# Altium footprint library SMotlaq-PCB_lib.PcbLib: 186 footprints (part 10 of 12)
Each footprint in its own frame and in the unit in brackets; x right, y up, seen from the top. Pads: shape width x height; smd on the part's side, far side on the other; paste and mask are expansions set on the pad; w line width, h text height; cw(c..) or ccw(c..) is an arc to the next point about the centre after c.
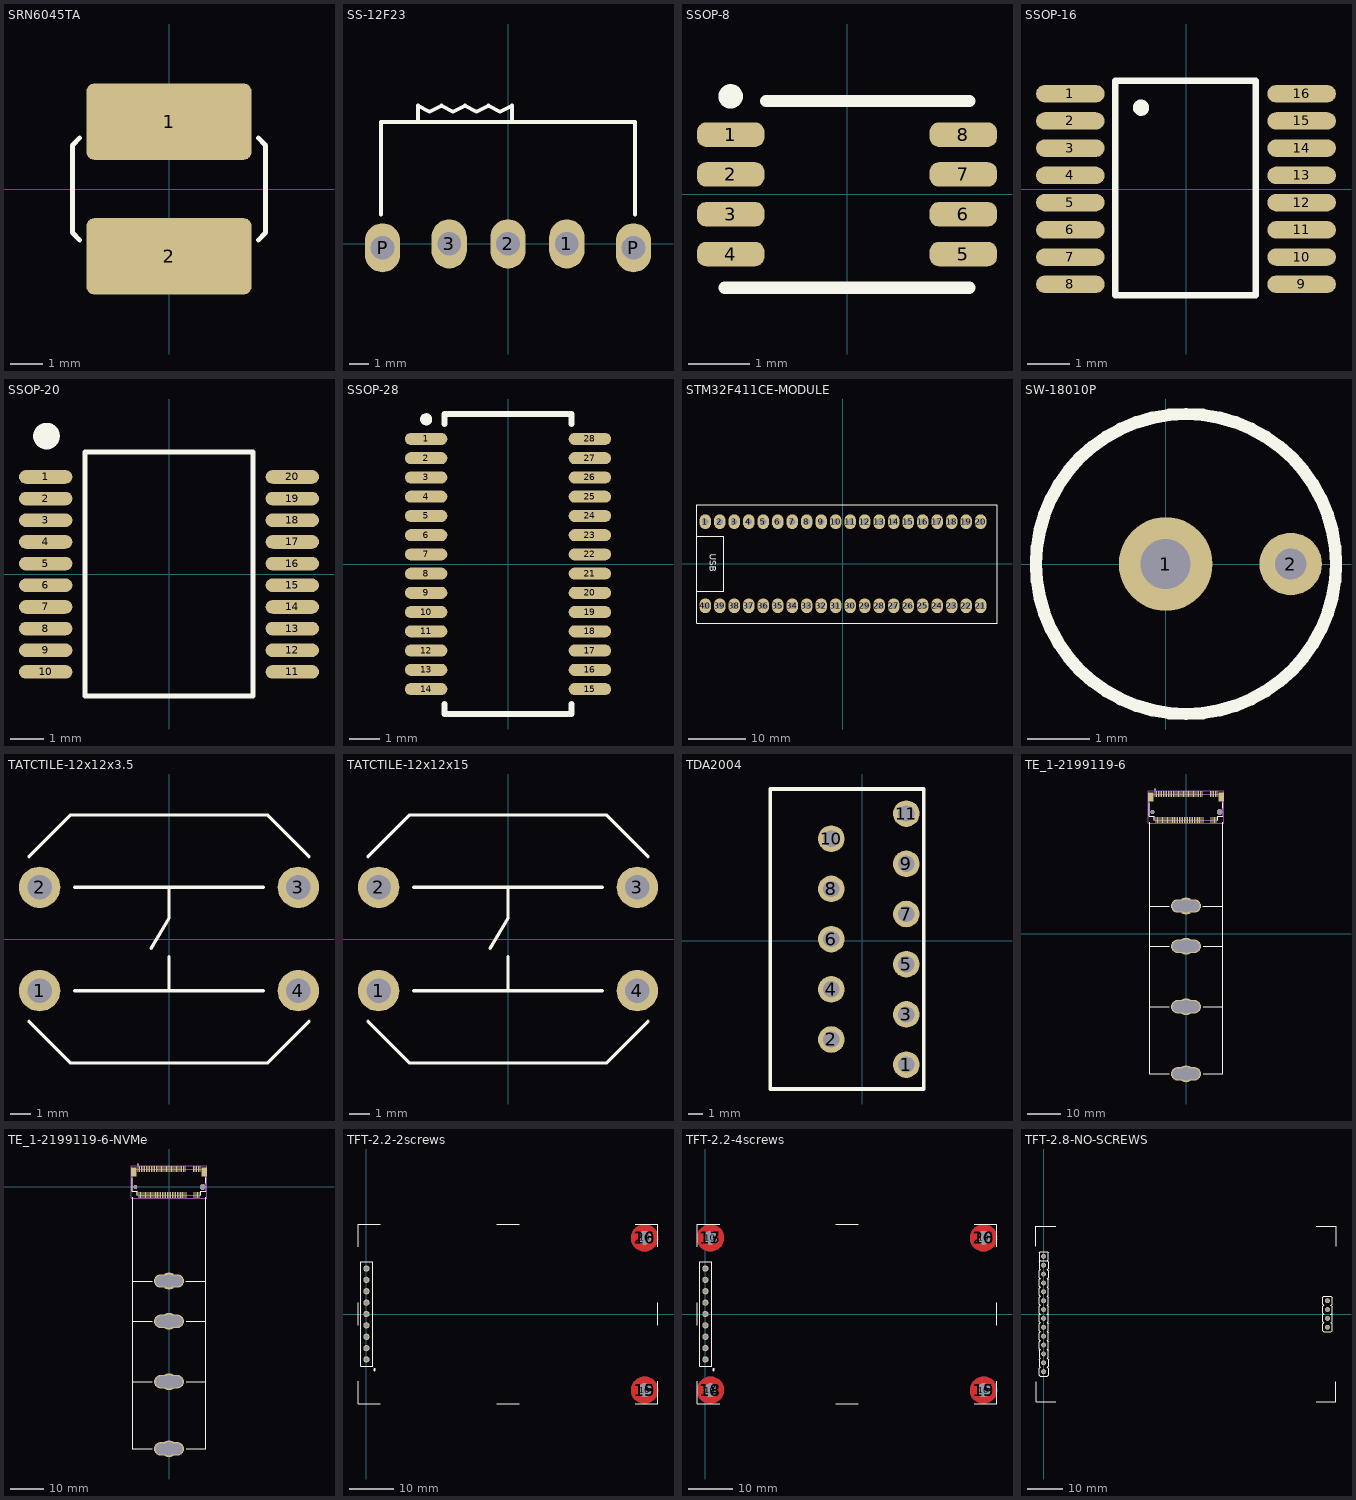
[diagram p9: the footprints below, top view; thin cyan lines are the x and y axes]

## SRN6045TA [mm]
pads (2):
  rrect20% 5.1x2.35 smd: 1(0,2.075) 2(0,-2.075)
Top Overlay:
  lines w0.15: -2.75,-1.575 -2.975,-1.35 -2.975,0 -2.975,1.35 -2.75,1.575 ; 2.75,-1.575 2.975,-1.35 2.975,0 2.975,1.35 2.75,1.575
3D body "User Library-SRN6045TA Series.step": height 4.2, standoff 0, extent -3,-3 3,3

## SS-12F23 [mm] "SPDT onboard slide switch"
pads (5):
  oval 1.8x2.5 hole 1.2 mask+0.075: 1(3,0) 2(0,0) 3(-3,0) P(-6.4,-0.2) P(6.4,-0.2)
Top Overlay:
  lines w0.2: -6.475,1.5 -6.475,6.2 ; -6.475,6.225 6.475,6.225 ; -4.6,6.225 -4.6,7.05 -4,6.75 -3.4,7.05 -2.8,6.75 -2.2,7.05 -1.6,6.75 -1,7.05 -0.4,6.75 0.2,7.05 0.2,6.25 ; 6.475,1.5 6.475,6.2
3D body "User Library-SLIDE SWITCH SS12F23.STEP": height 5.25, standoff -3.85, extent -6.5,-0.65 6.5,12.25

## SSOP-8 [mm]
height 1.2
pads (8):
  rrect75% 1.1x0.4 smd: 1(-1.9,0.975) 2(-1.9,0.325) 3(-1.9,-0.325) 4(-1.9,-0.975) 5(1.9,-0.975) 6(1.9,-0.325) 7(1.9,0.325) 8(1.9,0.975)
Top Overlay:
  circle w0.2: c-1.9,1.6 r0.1
  lines w0.2: -2,-1.525 2,-1.525 ; -1.325,1.525 2,1.525
3D body "User Library-DCT-8.STEP": height 1.3, standoff 0, extent -2.125,-1.525 2.075,1.525

## SSOP-16 [mm]
pads (16):
  rrect100% 1.6x0.41 smd: 1(-2.7,2.222) 2(-2.7,1.587) 3(-2.7,0.953) 4(-2.7,0.318) 5(-2.7,-0.318) 6(-2.7,-0.953) 7(-2.7,-1.587) 8(-2.7,-2.222) 9(2.7,-2.222) 10(2.7,-1.587) 11(2.7,-0.953) 12(2.7,-0.318) 13(2.7,0.318) 14(2.7,0.953) 15(2.7,1.587) 16(2.7,2.222)
Top Overlay:
  circle w0.2: c-1.05,1.897 r0.09
  lines w0.15: -1.65,-2.478 -1.65,2.522 1.625,2.522 1.625,-2.478 -1.65,-2.478
3D body "User Library-SSOP 16-pin.step": height 1.7, standoff -0.04, extent -3.127,-2.477 3.127,2.523

## SSOP-20 [mm]
pads (20):
  rrect100% 1.6x0.41 smd: 1(-3.7,2.925) 2(-3.7,2.275) 3(-3.7,1.625) 4(-3.7,0.975) 5(-3.7,0.325) 6(-3.7,-0.325) 7(-3.7,-0.975) 8(-3.7,-1.625) 9(-3.7,-2.275) 10(-3.7,-2.925) 11(3.7,-2.925) 12(3.7,-2.275) 13(3.7,-1.625) 14(3.7,-0.975) 15(3.7,-0.325) 16(3.7,0.325) 17(3.7,0.975) 18(3.7,1.625) 19(3.7,2.275) 20(3.7,2.925)
Top Overlay:
  circle w0.4: c-3.675,4.15 r0.2
  lines w0.15: -2.525,-3.65 -2.525,0 -2.525,3.675 -0.517,3.675 2.525,3.675 2.525,0 2.525,-3.65 -0.492,-3.65 -2.525,-3.65
3D body "User Library-SSOP 20 PIN-1.step": height 1.98, standoff -0.01, extent -3.95,-3.665 3.95,3.665

## SSOP-28 [mm] "SSOP, 28-Leads, 9.9x3.9mm, Pitch 0.635mm"
height 1.75
pads (28):
  oval 1.4x0.4 smd: 1(-2.7,4.127) 2(-2.7,3.492) 3(-2.7,2.857) 4(-2.7,2.222) 5(-2.7,1.587) 6(-2.7,0.953) 7(-2.7,0.318) 8(-2.7,-0.318) 9(-2.7,-0.953) 10(-2.7,-1.587) 11(-2.7,-2.222) 12(-2.7,-2.857) 13(-2.7,-3.492) 14(-2.7,-4.127) 15(2.7,-4.127) 16(2.7,-3.492) 17(2.7,-2.857) 18(2.7,-2.222) 19(2.7,-1.587) 20(2.7,-0.953) 21(2.7,-0.318) 22(2.7,0.318) 23(2.7,0.953) 24(2.7,1.587) 25(2.7,2.222) 26(2.7,2.857) 27(2.7,3.492) 28(2.7,4.127)
Top Overlay:
  circle w0.2: c-2.7,4.775 r0.1
  lines w0.2: -2.1,-4.625 -2.1,-4.95 2.1,-4.95 2.1,-4.625 ; -2.1,4.625 -2.1,4.95 2.1,4.95 2.1,4.625
3D body "SOG63_28.step": height 1.75, standoff 0, extent -3,-4.95 3,4.95

## STM32F411CE-MODULE [mm]
pads (40):
  oval 2x2.6 hole 1.1: 1(-24.13,7.37) 2(-21.59,7.37) 3(-19.05,7.37) 4(-16.51,7.37) 5(-13.97,7.37) 6(-11.43,7.37) 7(-8.89,7.37) 8(-6.35,7.37) 9(-3.81,7.37) 10(-1.27,7.37) 11(1.27,7.37) 12(3.81,7.37) 13(6.35,7.37) 14(8.89,7.37) 15(11.43,7.37) 16(13.97,7.37) 17(16.51,7.37) 18(19.05,7.37) 19(21.59,7.37) 20(24.13,7.37) 21(24.13,-7.37) 22(21.59,-7.37) 23(19.05,-7.37) 24(16.51,-7.37) 25(13.97,-7.37) 26(11.43,-7.37) 27(8.89,-7.37) 28(6.35,-7.37) 29(3.81,-7.37) 30(1.27,-7.37) 31(-1.27,-7.37) 32(-3.81,-7.37) 33(-6.35,-7.37) 34(-8.89,-7.37) 35(-11.43,-7.37) 36(-13.97,-7.37) 37(-16.51,-7.37) 38(-19.05,-7.37) 39(-21.59,-7.37) 40(-24.13,-7.37)
Top Overlay:
  lines w0.2: -25.58,-4.855 -20.88,-4.855 -20.88,4.855 -25.58,4.855 ; -25.58,-10.445 -25.58,10.355 26.995,10.355 26.995,-10.445 -25.58,-10.445
  text "USB" at -23.796,1.781 h2
3D body "stm32f411-module.STEP": height 15.1, standoff -3.16, extent -25.56,-10.433 26.98,10.347

## SW-18010P [mm]
pads (2):
  round 1.5 hole 0.8: 1(0,0)
  round 1 hole 0.5: 2(2,0)
Top Overlay:
  circle w0.2: c0.325,0 r2.4
3D body "SW-18010P-2.STEP": height 17.53, standoff -1.07, extent -1.925,-2.25 2.575,2.25

## TATCTILE-12x12x3.5 [mm]
pads (4):
  round 2 hole 1.2: 1(-6.25,-2.5) 2(-6.25,2.5) 3(6.25,2.5) 4(6.25,-2.5)
Top Overlay:
  lines w0.15: -6.775,-3.975 -4.75,-6 4.75,-6 6.775,-3.975 ; -6.775,3.975 -4.75,6 4.75,6 6.775,3.975 ; -4.575,-2.5 4.575,-2.5 ; -4.575,2.5 4.575,2.5 ; -0.866,-0.464 0,1 0,2.5 ; 0,-2.5 0,-0.85
3D body "User Library-Tactile Switch 12x12x8.step": height 8.15, standoff -3.25, extent -6.773,-6 6.773,6

## TATCTILE-12x12x15 [mm]
pads (4):
  round 2 hole 1.2: 1(-6.25,-2.5) 2(-6.25,2.5) 3(6.25,2.5) 4(6.25,-2.5)
Top Overlay:
  lines w0.15: -6.775,-3.975 -4.75,-6 4.75,-6 6.775,-3.975 ; -6.775,3.975 -4.75,6 4.75,6 6.775,3.975 ; -4.575,-2.5 4.575,-2.5 ; -4.575,2.5 4.575,2.5 ; -0.866,-0.464 0,1 0,2.5 ; 0,-2.5 0,-0.85
3D body "TS15-1212-150-BK-260-SCR-D.STEP": height 15, standoff -3.37, extent -6.9,-6 6.9,6

## TDA2004 [mm]
pads (11):
  round 1.8 hole 1.1: 1(3,-8.38) 2(-2.08,-6.68) 3(3,-4.98) 4(-2.08,-3.28) 5(3,-1.58) 6(-2.08,0.12) 7(3,1.82) 8(-2.08,3.52) 9(3,5.22) 10(-2.08,6.92) 11(3,8.62)
Top Overlay:
  lines w0.254: -6.223,-10.033 4.191,-10.033 4.191,10.287 -6.223,10.287 -6.223,-10.033
3D body "User Library-TDA 2004R.STEP": height 22, standoff -2.51, extent -6.223,-9.883 3.247,10.137

## TE_1-2199119-6 [mm]
pads (79):
  rect 0.3x1.75 smd: 1(-9.25,41.689) 2(-9,33.939) 3(-8.75,41.689) 4(-8.5,33.939) 5(-8.25,41.689) 6(-8,33.939) 7(-7.75,41.689) 8(-7.5,33.939) 9(-7.25,41.689) 10(-7,33.939) 11(-6.75,41.689) 12(-6.5,33.939) 13(-6.25,41.689) 14(-6,33.939) 15(-5.75,41.689) 16(-5.5,33.939) 17(-5.25,41.689) 18(-5,33.939) 19(-4.75,41.689) 20(-4.5,33.939) 21(-4.25,41.689) 22(-4,33.939) 23(-3.75,41.689) 24(-3.5,33.939) 25(-3.25,41.689) 26(-3,33.939) 27(-2.75,41.689) 28(-2.5,33.939) 29(-2.25,41.689) 30(-2,33.939) 31(-1.75,41.689) 32(-1.5,33.939) 33(-1.25,41.689) 34(-1,33.939) 35(-0.75,41.689) 36(-0.5,33.939) 37(-0.25,41.689) 38(0,33.939) 39(0.25,41.689) 40(0.5,33.939) 41(0.75,41.689) 42(1,33.939) 43(1.25,41.689) 44(1.5,33.939) 45(1.75,41.689) 46(2,33.939) 47(2.25,41.689) 48(2.5,33.939) 49(2.75,41.689) 50(3,33.939) 51(3.25,41.689) 52(3.5,33.939) 53(3.75,41.689) 54(4,33.939) 55(4.25,41.689) 56(4.5,33.939) 57(4.75,41.689) 58(5,33.939) 67(7.25,41.689) 68(7.5,33.939) 69(7.75,41.689) 70(8,33.939) 71(8.25,41.689) 72(8.5,33.939) 73(8.75,41.689) 74(9,33.939) 75(9.25,41.689)
  rect 1.5x2.75 smd: S1(-10.5,40.814) S2(10.5,40.814)
  round 1.15 hole 1.15 unplated: ""(-10,36.314)
  oval 9x4 hole 3.2 slot 8 at 0 deg unplated: ""(0,-41.689) ""(0,-21.689) ""(0,-3.688) ""(0,8.312)
  round 5 hole 4 unplated: ""(0,-41.689) ""(0,-21.689) ""(0,-3.688) ""(0,8.312)
  round 1.65 hole 1.65 unplated: ""(10,36.314)
Top Overlay:
  circle w0.2: c-9.25,43.064 r0.1
  lines w0.127: -10.95,39.119 -10.95,35.014 -9.5,35.014 -9.5,33.814 ; 9.5,33.814 9.5,35.014 10.95,35.014 ; 10.95,37.459 10.95,39.119
  lines w0.15: -10.931,-41.688 -10.931,33.312 ; -10.925,-21.689 -4.95,-21.689 ; -10.925,-3.688 -4.95,-3.688 ; -10.925,8.312 -5,8.314 ; -10.919,-41.688 -4.944,-41.688 ; 5,8.312 10.925,8.312 ; 5.075,-41.689 10.925,-41.689 ; 5.075,-21.689 10.925,-21.689 ; 5.075,-3.688 10.925,-3.688 ; 10.931,-41.688 10.931,33.312
Mechanical 13:
  circle w0.2: c-9.25,43.064 r0.1
  lines w0.127: -10.95,35.014 -9.5,35.014 -9.5,33.814 9.5,33.814 9.5,35.014 10.95,35.014 10.95,41.564 -10.95,41.564 -10.95,35.014
Mechanical 15:
  lines w0.05: -11.2,33.014 11.2,33.014 11.2,42.614 -11.2,42.614 -11.2,33.014
3D body "c-1-2199119-6-c-3d.stp": height 3.09, standoff -0.54, extent -10.95,33.464 10.95,42.164

## TE_1-2199119-6-NVMe [mm]
pads (79):
  rect 0.3x1.75 smd: 1(-9.25,5.375) 2(-9,-2.375) 3(-8.75,5.375) 4(-8.5,-2.375) 5(-8.25,5.375) 6(-8,-2.375) 7(-7.75,5.375) 8(-7.5,-2.375) 9(-7.25,5.375) 10(-7,-2.375) 11(-6.75,5.375) 12(-6.5,-2.375) 13(-6.25,5.375) 14(-6,-2.375) 15(-5.75,5.375) 16(-5.5,-2.375) 17(-5.25,5.375) 18(-5,-2.375) 19(-4.75,5.375) 20(-4.5,-2.375) 21(-4.25,5.375) 22(-4,-2.375) 23(-3.75,5.375) 24(-3.5,-2.375) 25(-3.25,5.375) 26(-3,-2.375) 27(-2.75,5.375) 28(-2.5,-2.375) 29(-2.25,5.375) 30(-2,-2.375) 31(-1.75,5.375) 32(-1.5,-2.375) 33(-1.25,5.375) 34(-1,-2.375) 35(-0.75,5.375) 36(-0.5,-2.375) 37(-0.25,5.375) 38(0,-2.375) 39(0.25,5.375) 40(0.5,-2.375) 41(0.75,5.375) 42(1,-2.375) 43(1.25,5.375) 44(1.5,-2.375) 45(1.75,5.375) 46(2,-2.375) 47(2.25,5.375) 48(2.5,-2.375) 49(2.75,5.375) 50(3,-2.375) 51(3.25,5.375) 52(3.5,-2.375) 53(3.75,5.375) 54(4,-2.375) 55(4.25,5.375) 56(4.5,-2.375) 57(4.75,5.375) 58(5,-2.375) 67(7.25,5.375) 68(7.5,-2.375) 69(7.75,5.375) 70(8,-2.375) 71(8.25,5.375) 72(8.5,-2.375) 73(8.75,5.375) 74(9,-2.375) 75(9.25,5.375)
  rect 1.5x2.75 smd: S1(-10.5,4.5) S2(10.5,4.5)
  round 1.15 hole 1.15 unplated: ""(-10,0)
  oval 9x4 hole 3.2 slot 8 at 0 deg unplated: ""(0,-78.002) ""(0,-58.002) ""(0,-40.002) ""(0,-28.002)
  round 5 hole 4 unplated: ""(0,-78.002) ""(0,-58.002) ""(0,-40.002) ""(0,-28.002)
  round 1.65 hole 1.65 unplated: ""(10,0)
Top Overlay:
  circle w0.2: c-9.25,6.75 r0.1
  lines w0.127: -10.95,2.805 -10.95,-1.3 -9.5,-1.3 -9.5,-2.5 ; 9.5,-2.5 9.5,-1.3 10.95,-1.3 ; 10.95,1.145 10.95,2.805
  lines w0.15: -10.931,-78.002 -10.931,-3.002 ; -10.925,-58.002 -4.95,-58.002 ; -10.925,-40.002 -4.95,-40.002 ; -10.925,-28.002 -5,-28 ; -10.919,-78.002 -4.944,-78.002 ; 5,-28.002 10.925,-28.002 ; 5.075,-78.002 10.925,-78.002 ; 5.075,-58.002 10.925,-58.002 ; 5.075,-40.002 10.925,-40.002 ; 10.931,-78.002 10.931,-3.002
Mechanical 13:
  circle w0.2: c-9.25,6.75 r0.1
  lines w0.127: -10.95,-1.3 -9.5,-1.3 -9.5,-2.5 9.5,-2.5 9.5,-1.3 10.95,-1.3 10.95,5.25 -10.95,5.25 -10.95,-1.3
Mechanical 15:
  lines w0.05: -11.2,-3.3 11.2,-3.3 11.2,6.3 -11.2,6.3 -11.2,-3.3
3D body "c-1-2199119-6-c-3d.stp": height 3.09, standoff -0.54, extent -10.95,-2.85 10.95,5.85
3D body "Samsung 850 EVO M.2 250GB SSD.STEP": height 3.5, standoff 1.93, extent -11.075,-78.002 11.075,2.148

## TFT-2.2-2screws [mm]
pads (15):
  round 1.4 / inner round 1.4 / far side oval 2.2x1.4 hole 1 mask+0.1: 1(0,10.16) 2(0,7.62) 3(0,5.08) 4(0,2.54) 5(0,0) 6(0,-2.54) 7(0,-5.08) 8(0,-7.62) 9(0,-10.16)
  round 3 hole 3: 10(62.125,-17) 10(62.125,17)
  round 6 on Top Solder: 15(62.125,-17) 16(62.125,17)
  round 6 on Bottom Solder: 19(62.125,-17) 20(62.125,17)
Top Layer:
  pour cut-out: 62.1,-20 62.298,-20 62.691,-19.948 63.074,-19.846 63.441,-19.694 63.784,-19.496 64.099,-19.254 64.379,-18.974 64.621,-18.659 64.819,-18.316 64.971,-17.949 65.073,-17.566 65.125,-17.173 65.125,-16.975 65.125,-16.78 65.074,-16.393 64.973,-16.017 64.824,-15.656 64.629,-15.319 64.392,-15.009 64.116,-14.733 63.806,-14.496 63.469,-14.301 63.108,-14.152 62.732,-14.051 62.345,-14 62.15,-14 61.952,-14 61.559,-14.052 61.176,-14.154 60.809,-14.306 60.466,-14.504 60.151,-14.746 59.871,-15.026 59.629,-15.341 59.431,-15.684 59.279,-16.051 59.177,-16.434 59.125,-16.827 59.125,-17.025 59.125,-17.22 59.176,-17.607 59.277,-17.983 59.426,-18.344 59.621,-18.681 59.858,-18.991 60.134,-19.267 60.444,-19.504 60.781,-19.699 61.142,-19.848 61.518,-19.949 61.905,-20
  pour cut-out: 62.1,14 62.298,14 62.691,14.052 63.074,14.154 63.441,14.306 63.784,14.504 64.099,14.746 64.379,15.026 64.621,15.341 64.819,15.684 64.971,16.051 65.073,16.434 65.125,16.827 65.125,17.025 65.125,17.22 65.074,17.607 64.973,17.983 64.824,18.344 64.629,18.681 64.392,18.991 64.116,19.267 63.806,19.504 63.469,19.699 63.108,19.848 62.732,19.949 62.345,20 62.15,20 61.952,20 61.559,19.948 61.176,19.846 60.809,19.694 60.466,19.496 60.151,19.254 59.871,18.974 59.629,18.659 59.431,18.316 59.279,17.949 59.177,17.566 59.125,17.173 59.125,16.975 59.125,16.78 59.176,16.393 59.277,16.017 59.426,15.656 59.621,15.319 59.858,15.009 60.134,14.733 60.444,14.496 60.781,14.301 61.142,14.152 61.518,14.051 61.905,14
Bottom Layer:
  pour cut-out: 62.1,14 62.298,14 62.691,14.052 63.074,14.154 63.441,14.306 63.784,14.504 64.099,14.746 64.379,15.026 64.621,15.341 64.819,15.684 64.971,16.051 65.073,16.434 65.125,16.827 65.125,17.025 65.125,17.22 65.074,17.607 64.973,17.983 64.824,18.344 64.629,18.681 64.392,18.991 64.116,19.267 63.806,19.504 63.469,19.699 63.108,19.848 62.732,19.949 62.345,20 62.15,20 61.952,20 61.559,19.948 61.176,19.846 60.809,19.694 60.466,19.496 60.151,19.254 59.871,18.974 59.629,18.659 59.431,18.316 59.279,17.949 59.177,17.566 59.125,17.173 59.125,16.975 59.125,16.78 59.176,16.393 59.277,16.017 59.426,15.656 59.621,15.319 59.858,15.009 60.134,14.733 60.444,14.496 60.781,14.301 61.142,14.152 61.518,14.051 61.905,14
  pour cut-out: 62.1,-20 62.298,-20 62.691,-19.948 63.074,-19.846 63.441,-19.694 63.784,-19.496 64.099,-19.254 64.379,-18.974 64.621,-18.659 64.819,-18.316 64.971,-17.949 65.073,-17.566 65.125,-17.173 65.125,-16.975 65.125,-16.78 65.074,-16.393 64.973,-16.017 64.824,-15.656 64.629,-15.319 64.392,-15.009 64.116,-14.733 63.806,-14.496 63.469,-14.301 63.108,-14.152 62.732,-14.051 62.345,-14 62.15,-14 61.952,-14 61.559,-14.052 61.176,-14.154 60.809,-14.306 60.466,-14.504 60.151,-14.746 59.871,-15.026 59.629,-15.341 59.431,-15.684 59.279,-16.051 59.177,-16.434 59.125,-16.827 59.125,-17.025 59.125,-17.22 59.176,-17.607 59.277,-17.983 59.426,-18.344 59.621,-18.681 59.858,-18.991 60.134,-19.267 60.444,-19.504 60.781,-19.699 61.142,-19.848 61.518,-19.949 61.905,-20
Top Overlay:
  circle w0.2: c1.825,-12.425 r0.2
  lines w0.15: -1.875,-14.975 -1.875,-20 3.15,-20 ; -1.875,-2.512 -1.875,2.513 ; -1.875,14.975 -1.875,20 3.15,20 ; 29.113,-20 34.138,-20 ; 29.113,20 34.138,20 ; 60.1,-20 65.125,-20 65.125,-14.975 ; 60.1,20 65.125,20 65.125,14.975 ; 65.125,-2.512 65.125,2.513
  lines w0.2: -1.3,-11.7 -1.3,11.7 1.4,11.7 1.4,-11.7 -1.3,-11.7
3D body "female_header_a-bl254-eg-g03d.stp": height 8.5, standoff -3.2, extent -1.2,3.685 1.3,11.555
3D body "female_header_a-bl254-eg-g03d.stp": height 8.5, standoff -3.2, extent -1.2,-3.935 1.3,3.935
3D body "female_header_a-bl254-eg-g03d.stp": height 8.5, standoff -3.2, extent -1.2,-11.555 1.3,-3.685
3D body "User Library-2_2inTFT.step": height 15.6, standoff 4.5, extent -1.875,-20 65.125,20

## TFT-2.2-4screws [mm]
pads (21):
  round 1.4 / inner round 1.4 / far side oval 2.2x1.4 hole 1 mask+0.1: 1(0,10.16) 2(0,7.62) 3(0,5.08) 4(0,2.54) 5(0,0) 6(0,-2.54) 7(0,-5.08) 8(0,-7.62) 9(0,-10.16)
  round 3 hole 3: 10(1.125,-17) 10(1.125,17) 10(62.125,-17) 10(62.125,17)
  round 6 on Top Solder: 13(1.125,17) 14(1.125,-17) 15(62.125,-17) 16(62.125,17)
  round 6 on Bottom Solder: 17(1.125,17) 18(1.125,-17) 19(62.125,-17) 20(62.125,17)
Top Layer:
  pour cut-out: 62.1,-20 62.298,-20 62.691,-19.948 63.074,-19.846 63.441,-19.694 63.784,-19.496 64.099,-19.254 64.379,-18.974 64.621,-18.659 64.819,-18.316 64.971,-17.949 65.073,-17.566 65.125,-17.173 65.125,-16.975 65.125,-16.78 65.074,-16.393 64.973,-16.017 64.824,-15.656 64.629,-15.319 64.392,-15.009 64.116,-14.733 63.806,-14.496 63.469,-14.301 63.108,-14.152 62.732,-14.051 62.345,-14 62.15,-14 61.952,-14 61.559,-14.052 61.176,-14.154 60.809,-14.306 60.466,-14.504 60.151,-14.746 59.871,-15.026 59.629,-15.341 59.431,-15.684 59.279,-16.051 59.177,-16.434 59.125,-16.827 59.125,-17.025 59.125,-17.22 59.176,-17.607 59.277,-17.983 59.426,-18.344 59.621,-18.681 59.858,-18.991 60.134,-19.267 60.444,-19.504 60.781,-19.699 61.142,-19.848 61.518,-19.949 61.905,-20
  pour cut-out: 62.1,14 62.298,14 62.691,14.052 63.074,14.154 63.441,14.306 63.784,14.504 64.099,14.746 64.379,15.026 64.621,15.341 64.819,15.684 64.971,16.051 65.073,16.434 65.125,16.827 65.125,17.025 65.125,17.22 65.074,17.607 64.973,17.983 64.824,18.344 64.629,18.681 64.392,18.991 64.116,19.267 63.806,19.504 63.469,19.699 63.108,19.848 62.732,19.949 62.345,20 62.15,20 61.952,20 61.559,19.948 61.176,19.846 60.809,19.694 60.466,19.496 60.151,19.254 59.871,18.974 59.629,18.659 59.431,18.316 59.279,17.949 59.177,17.566 59.125,17.173 59.125,16.975 59.125,16.78 59.176,16.393 59.277,16.017 59.426,15.656 59.621,15.319 59.858,15.009 60.134,14.733 60.444,14.496 60.781,14.301 61.142,14.152 61.518,14.051 61.905,14
  pour cut-out: 1.1,14 1.298,14 1.691,14.052 2.074,14.154 2.441,14.306 2.784,14.504 3.099,14.746 3.379,15.026 3.621,15.341 3.819,15.684 3.971,16.051 4.073,16.434 4.125,16.827 4.125,17.025 4.125,17.22 4.074,17.607 3.973,17.983 3.824,18.344 3.629,18.681 3.392,18.991 3.116,19.267 2.806,19.504 2.469,19.699 2.108,19.848 1.732,19.949 1.345,20 1.15,20 0.952,20 0.559,19.948 0.176,19.846 -0.191,19.694 -0.534,19.496 -0.849,19.254 -1.129,18.974 -1.371,18.659 -1.569,18.316 -1.721,17.949 -1.823,17.566 -1.875,17.173 -1.875,16.975 -1.875,16.78 -1.824,16.393 -1.723,16.017 -1.574,15.656 -1.379,15.319 -1.142,15.009 -0.866,14.733 -0.556,14.496 -0.219,14.301 0.142,14.152 0.518,14.051 0.905,14
  pour cut-out: 1.1,-20 1.298,-20 1.691,-19.948 2.074,-19.846 2.441,-19.694 2.784,-19.496 3.099,-19.254 3.379,-18.974 3.621,-18.659 3.819,-18.316 3.971,-17.949 4.073,-17.566 4.125,-17.173 4.125,-16.975 4.125,-16.78 4.074,-16.393 3.973,-16.017 3.824,-15.656 3.629,-15.319 3.392,-15.009 3.116,-14.733 2.806,-14.496 2.469,-14.301 2.108,-14.152 1.732,-14.051 1.345,-14 1.15,-14 0.952,-14 0.559,-14.052 0.176,-14.154 -0.191,-14.306 -0.534,-14.504 -0.849,-14.746 -1.129,-15.026 -1.371,-15.341 -1.569,-15.684 -1.721,-16.051 -1.823,-16.434 -1.875,-16.827 -1.875,-17.025 -1.875,-17.22 -1.824,-17.607 -1.723,-17.983 -1.574,-18.344 -1.379,-18.681 -1.142,-18.991 -0.866,-19.267 -0.556,-19.504 -0.219,-19.699 0.142,-19.848 0.518,-19.949 0.905,-20
Bottom Layer:
  pour cut-out: 1.1,-20 1.298,-20 1.691,-19.948 2.074,-19.846 2.441,-19.694 2.784,-19.496 3.099,-19.254 3.379,-18.974 3.621,-18.659 3.819,-18.316 3.971,-17.949 4.073,-17.566 4.125,-17.173 4.125,-16.975 4.125,-16.78 4.074,-16.393 3.973,-16.017 3.824,-15.656 3.629,-15.319 3.392,-15.009 3.116,-14.733 2.806,-14.496 2.469,-14.301 2.108,-14.152 1.732,-14.051 1.345,-14 1.15,-14 0.952,-14 0.559,-14.052 0.176,-14.154 -0.191,-14.306 -0.534,-14.504 -0.849,-14.746 -1.129,-15.026 -1.371,-15.341 -1.569,-15.684 -1.721,-16.051 -1.823,-16.434 -1.875,-16.827 -1.875,-17.025 -1.875,-17.22 -1.824,-17.607 -1.723,-17.983 -1.574,-18.344 -1.379,-18.681 -1.142,-18.991 -0.866,-19.267 -0.556,-19.504 -0.219,-19.699 0.142,-19.848 0.518,-19.949 0.905,-20
  pour cut-out: 1.1,14 1.298,14 1.691,14.052 2.074,14.154 2.441,14.306 2.784,14.504 3.099,14.746 3.379,15.026 3.621,15.341 3.819,15.684 3.971,16.051 4.073,16.434 4.125,16.827 4.125,17.025 4.125,17.22 4.074,17.607 3.973,17.983 3.824,18.344 3.629,18.681 3.392,18.991 3.116,19.267 2.806,19.504 2.469,19.699 2.108,19.848 1.732,19.949 1.345,20 1.15,20 0.952,20 0.559,19.948 0.176,19.846 -0.191,19.694 -0.534,19.496 -0.849,19.254 -1.129,18.974 -1.371,18.659 -1.569,18.316 -1.721,17.949 -1.823,17.566 -1.875,17.173 -1.875,16.975 -1.875,16.78 -1.824,16.393 -1.723,16.017 -1.574,15.656 -1.379,15.319 -1.142,15.009 -0.866,14.733 -0.556,14.496 -0.219,14.301 0.142,14.152 0.518,14.051 0.905,14
  pour cut-out: 62.1,14 62.298,14 62.691,14.052 63.074,14.154 63.441,14.306 63.784,14.504 64.099,14.746 64.379,15.026 64.621,15.341 64.819,15.684 64.971,16.051 65.073,16.434 65.125,16.827 65.125,17.025 65.125,17.22 65.074,17.607 64.973,17.983 64.824,18.344 64.629,18.681 64.392,18.991 64.116,19.267 63.806,19.504 63.469,19.699 63.108,19.848 62.732,19.949 62.345,20 62.15,20 61.952,20 61.559,19.948 61.176,19.846 60.809,19.694 60.466,19.496 60.151,19.254 59.871,18.974 59.629,18.659 59.431,18.316 59.279,17.949 59.177,17.566 59.125,17.173 59.125,16.975 59.125,16.78 59.176,16.393 59.277,16.017 59.426,15.656 59.621,15.319 59.858,15.009 60.134,14.733 60.444,14.496 60.781,14.301 61.142,14.152 61.518,14.051 61.905,14
  pour cut-out: 62.1,-20 62.298,-20 62.691,-19.948 63.074,-19.846 63.441,-19.694 63.784,-19.496 64.099,-19.254 64.379,-18.974 64.621,-18.659 64.819,-18.316 64.971,-17.949 65.073,-17.566 65.125,-17.173 65.125,-16.975 65.125,-16.78 65.074,-16.393 64.973,-16.017 64.824,-15.656 64.629,-15.319 64.392,-15.009 64.116,-14.733 63.806,-14.496 63.469,-14.301 63.108,-14.152 62.732,-14.051 62.345,-14 62.15,-14 61.952,-14 61.559,-14.052 61.176,-14.154 60.809,-14.306 60.466,-14.504 60.151,-14.746 59.871,-15.026 59.629,-15.341 59.431,-15.684 59.279,-16.051 59.177,-16.434 59.125,-16.827 59.125,-17.025 59.125,-17.22 59.176,-17.607 59.277,-17.983 59.426,-18.344 59.621,-18.681 59.858,-18.991 60.134,-19.267 60.444,-19.504 60.781,-19.699 61.142,-19.848 61.518,-19.949 61.905,-20
Top Overlay:
  circle w0.2: c1.825,-12.425 r0.2
  lines w0.15: -1.875,-14.975 -1.875,-20 3.15,-20 ; -1.875,-2.512 -1.875,2.513 ; -1.875,14.975 -1.875,20 3.15,20 ; 29.113,-20 34.138,-20 ; 29.113,20 34.138,20 ; 60.1,-20 65.125,-20 65.125,-14.975 ; 60.1,20 65.125,20 65.125,14.975 ; 65.125,-2.512 65.125,2.513
  lines w0.2: -1.3,-11.7 -1.3,11.7 1.4,11.7 1.4,-11.7 -1.3,-11.7
3D body "female_header_a-bl254-eg-g03d.stp": height 8.5, standoff -3.2, extent -1.2,3.685 1.3,11.555
3D body "female_header_a-bl254-eg-g03d.stp": height 8.5, standoff -3.2, extent -1.2,-3.935 1.3,3.935
3D body "female_header_a-bl254-eg-g03d.stp": height 8.5, standoff -3.2, extent -1.2,-11.555 1.3,-3.685
3D body "User Library-2_2inTFT.step": height 15.6, standoff 4.5, extent -1.875,-20 65.125,20

## TFT-2.8-NO-SCREWS [mm]
pads (18):
  round 1.4 / inner round 1.4 / far side oval 2.2x1.4 hole 1 mask+0.1: 1(0,16.51) 2(0,13.97) 3(0,11.43) 4(0,8.89) 5(0,6.35) 6(0,3.81) 7(0,1.27) 8(0,-1.27) 9(0,-3.81) 10(0,-6.35) 11(0,-8.89) 12(0,-11.43) 13(0,-13.97) 14(0,-16.51) 15(81.28,3.81) 16(81.28,1.27) 17(81.28,-1.27) 18(81.28,-3.81)
Top Overlay:
  lines w0.15: -2.175,-19.45 -2.175,-25.075 3.45,-25.075 ; -2.175,19.45 -2.175,25.075 3.45,25.075 ; 78.1,-25.075 83.725,-25.075 83.725,-19.45 ; 78.1,25.075 83.725,25.075 83.725,19.45
  lines w0.2: -1,-15.27 -1.3,-14.97 -1.3,-12.97 -1,-12.67 ; -1,-15.21 -1.3,-15.51 -1.3,-17.51 -1,-17.81 1,-17.81 1.3,-17.51 1.3,-15.51 1,-15.21 ; -1,-12.73 -1.3,-12.43 -1.3,-10.43 -1,-10.13 ; -1,-10.19 -1.3,-9.89 -1.3,-7.89 -1,-7.59 ; -1,-7.65 -1.3,-7.35 -1.3,-5.35 -1,-5.05 ; -1,-5.11 -1.3,-4.81 -1.3,-2.81 -1,-2.51 ; -1,-2.57 -1.3,-2.27 -1.3,-0.27 -1,0.03 ; -1,-0.03 -1.3,0.27 -1.3,2.27 -1,2.57 ; -1,2.51 -1.3,2.81 -1.3,4.81 -1,5.11 ; -1,5.05 -1.3,5.35 -1.3,7.35 -1,7.65 ; -1,7.59 -1.3,7.89 -1.3,9.89 -1,10.19 ; -1,10.13 -1.3,10.43 -1.3,12.43 -1,12.73 ; -1,12.67 -1.3,12.97 -1.3,14.97 -1.05,15.22 1.05,15.22 1.3,14.97 1.3,12.97 1,12.67 ; -1,15.21 -1.3,15.51 -1.3,17.51 -1,17.81 1,17.81 1.3,17.51 1.3,15.51 1,15.21 ; 1,-15.27 1.3,-14.97 1.3,-12.97 1,-12.67 ; 1,-12.73 1.3,-12.43 1.3,-10.43 1,-10.13 ; 1,-10.19 1.3,-9.89 1.3,-7.89 1,-7.59 ; 1,-7.65 1.3,-7.35 1.3,-5.35 1,-5.05 ; 1,-5.11 1.3,-4.81 1.3,-2.81 1,-2.51 ; 1,-2.57 1.3,-2.27 1.3,-0.27 1,0.03 ; 1,-0.03 1.3,0.27 1.3,2.27 1,2.57 ; 1,2.51 1.3,2.81 1.3,4.81 1,5.11 ; 1,5.05 1.3,5.35 1.3,7.35 1,7.65 ; 1,7.59 1.3,7.89 1.3,9.89 1,10.19 ; 1,10.13 1.3,10.43 1.3,12.43 1,12.73 ; 80.28,-2.57 79.98,-2.27 79.98,-0.27 80.28,0.03 ; 80.28,-2.51 79.98,-2.81 79.98,-4.81 80.28,-5.11 82.28,-5.11 82.58,-4.81 82.58,-2.81 82.28,-2.51 ; 80.28,-0.03 79.98,0.27 79.98,2.27 80.28,2.57 ; 80.28,2.51 79.98,2.81 79.98,4.81 80.28,5.11 82.28,5.11 82.58,4.81 82.58,2.81 82.28,2.51 ; 82.28,-2.57 82.58,-2.27 82.58,-0.27 82.28,0.03 ; 82.28,-0.03 82.58,0.27 82.58,2.27 82.28,2.57
3D body "PBD-2.stp": height 8.5, standoff -3.15, extent 80.01,-5.08 82.55,0
3D body "PBD-2.stp": height 8.5, standoff -3.15, extent 80.01,0 82.55,5.08
3D body "PBD-2.stp": height 8.5, standoff -3.15, extent -1.27,12.7 1.27,17.78
3D body "PBD-2.stp": height 8.5, standoff -3.15, extent -1.27,7.62 1.27,12.7
3D body "PBD-2.stp": height 8.5, standoff -3.15, extent -1.27,2.54 1.27,7.62
3D body "PBD-2.stp": height 8.5, standoff -3.15, extent -1.27,-2.54 1.27,2.54
3D body "PBD-2.stp": height 8.5, standoff -3.15, extent -1.27,-7.62 1.27,-2.54
3D body "PBD-2.stp": height 8.5, standoff -3.15, extent -1.27,-12.7 1.27,-7.62
3D body "PBD-2.stp": height 8.5, standoff -3.15, extent -1.27,-17.78 1.27,-12.7
3D body "2.8 TFT Module.stp": height 15.34, standoff 3.35, extent -2.176,-25.114 83.726,25.076